# Altium footprint library Tramdo.PcbLib: 11 footprints
Each footprint in its own frame and in the unit in brackets; x right, y up, seen from the top. Pads: shape width x height; smd on the part's side, far side on the other; paste and mask are expansions set on the pad; w line width, h text height; cw(c..) or ccw(c..) is an arc to the next point about the centre after c.
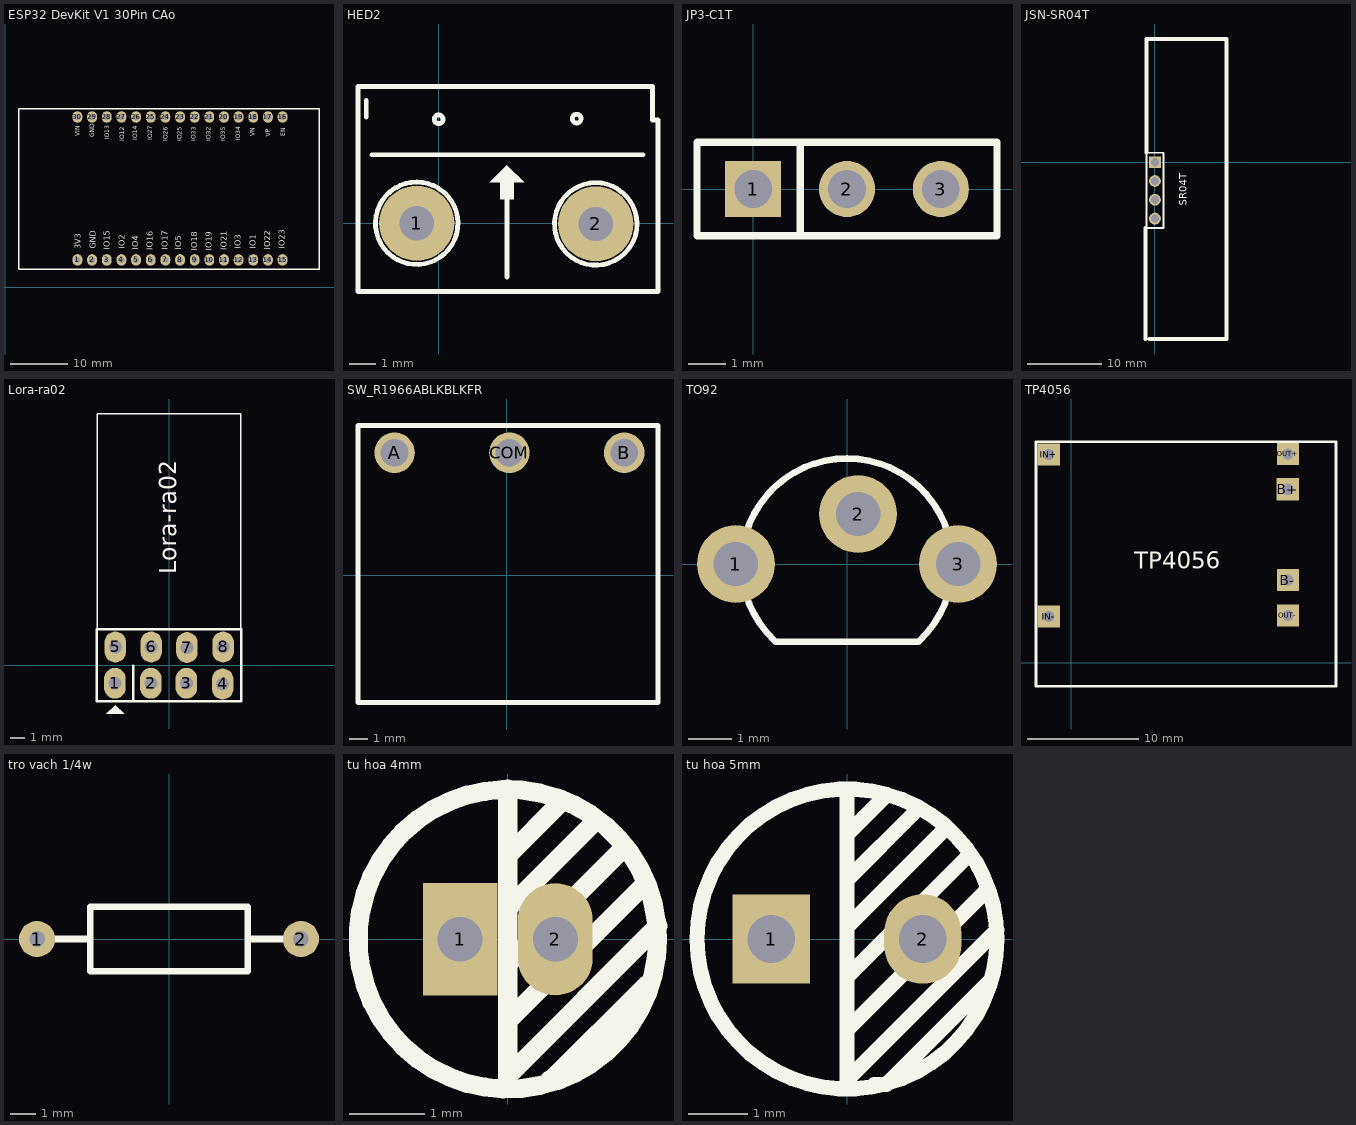
[diagram p0: the footprints below, top view; thin cyan lines are the x and y axes]

## ESP32 DevKit V1 30Pin CAo [mm]
pads (30):
  oval 1.7x2 hole 1: 1(12.505,4.719) 2(15.045,4.719) 3(17.585,4.719) 4(20.125,4.719) 5(22.665,4.719) 6(25.205,4.719) 7(27.745,4.719) 8(30.285,4.719) 9(32.825,4.719) 10(35.365,4.719) 11(37.905,4.719) 12(40.445,4.719) 13(42.985,4.719) 14(45.525,4.719) 15(48.065,4.719) 16(48.065,29.489) 17(45.525,29.489) 18(42.985,29.489) 19(40.445,29.489) 20(37.905,29.489) 21(35.365,29.489) 22(32.825,29.489) 23(30.285,29.489) 24(27.745,29.489) 25(25.205,29.489) 26(22.665,29.489) 27(20.125,29.489) 28(17.585,29.489) 29(15.045,29.489) 30(12.505,29.489)
Top Overlay:
  lines w0.254: 2.375,3.059 54.375,3.059 54.375,30.959 2.375,30.959 2.375,3.059
  text "EN" at 48.49,26.15 h0.76
  text "IO34" at 40.76,25.38 h0.76
  text "VN" at 43.28,26.12 h0.76
  text "IO32" at 35.64,25.3 h0.76
  text "IO35" at 38.1,25.27 h0.76
  text "VP" at 45.89,26.09 h0.76
  text "IO23" at 48.41,6.61 h1.02
  text "IO3" at 40.84,6.65 h1.02
  text "IO1" at 43.42,6.61 h1.02
  text "IO22" at 45.95,6.49 h1.02
  text "IO19" at 35.77,6.29 h1.02
  text "IO21" at 38.35,6.37 h1.02
  text "IO18" at 33.31,6.33 h1.02
  text "IO27" at 25.44,25.42 h0.76
  text "IO33" at 33.01,25.3 h0.76
  text "IO25" at 30.59,25.25 h0.76
  text "IO26" at 28.12,25.31 h0.76
  text "IO14" at 22.87,25.42 h0.76
  text "IO13" at 17.99,25.54 h0.76
  text "GND" at 15.46,25.99 h0.76
  text "VIN" at 12.9,26.14 h0.76
  text "IO17" at 28.2,6.45 h1.02
  text "IO5" at 30.5,6.49 h1.02
  text "IO16" at 25.55,6.37 h1.02
  text "IO4" at 23.01,6.52 h1.02
  text "IO12" at 20.58,25.31 h0.76
  text "IO2" at 20.67,6.64 h1.02
  text "GND" at 15.64,6.64 h1.02
  text "3V3" at 13.061,6.575 h1.02
  text "IO15" at 18.14,6.44 h1.02
3D body "ESP-32_v1.STEP": height 13.7, standoff 1.3, extent 2.54,2.91 53.47,31.41
3D body "PinSocket_1x15_P2.54mm_Vertical.step": height 7, standoff -3.1, extent 11.235,28.219 49.335,30.759
3D body "PinSocket_1x15_P2.54mm_Vertical.step": height 7, standoff -3.1, extent 11.235,3.449 49.335,5.989

## HED2 [mil] "Header 2, 2 pin, hight 300mil, Pin to Pin 200, Colour Green"
height 300
pads (2):
  round 110 hole 50: 1(-32,0) 2(230,-1)
Top Overlay:
  circle w7: c202,153 r6.4
  circle w7: c0,152 r6.4
  region: 100,85 75,60 90,60 90,35 110,35 110,60 125,60
  lines w7: -106,155 -106,180 ; -98,100 299,100 ; 6.72,46.1 ccw(c-32.11,-0.12) 8,45 ; 100,-79 100,72 ; 268.63,45.18 ccw(c229.89,-1.12) 270,44 ; -118,-100 321,-100 321,151 313,151 313,182 313,200 -118,200 -118,68 -118,-100
3D body "SW3dPS-KRM2.STEP": height 393.7, standoff -157.48, extent -96.7,-138.64 297,156.64

## JP3-C1T [mm] "3 row, straight, gold plating"
height 8.5
pads (3):
  rect 1.52x1.52 hole 1.02: 1(0,0)
  round 1.52 hole 1.02: 2(2.54,0) 3(5.08,0)
Top Overlay:
  lines w0.2: 1.27,-1.27 1.27,1.27 ; -1.52,-1.27 6.6,-1.27 6.6,1.27 -1.52,1.27 -1.52,-1.27
3D body "61300311821.stp": height 8.51, standoff -3.09, extent -1.52,-1.25 6.6,1.25

## JSN-SR04T [mm] "Sensor sieu am use 3.3V-5V"
pads (4):
  round 1.6 hole 1.1: Echo(0,-2.54) Trig(0,-5.08) VCC(0,-7.62)
  rect 1.6x1.6 hole 1.1: GND(0,0)
Top Overlay:
  lines w0.254: -1.143,-8.89 -1.143,1.27 1.143,1.27 1.143,-8.89 -1.143,-8.89
  lines w0.5: -1.27,-23.876 -1.27,-8.89 ; -1.143,1.27 -1.143,16.637 9.652,16.637 9.652,-23.876 -0.762,-23.876
  text "SR04T" at 4.318,-5.889 h1
Mechanical 1:
  lines w0.1: -1.27,-23.876 -0.762,-23.876 ; 9.525,16.51 9.652,16.637
3D body "User Library-RM254_4pin.STEP": height 6.03, standoff -3.09, extent -1.27,-9.017 1.27,1.143
3D body "JSN20.stp": height 23.27, standoff -10.25, extent -2.54,-25.125 15.61,16.235

## Lora-ra02 [mil] "Connector 4x2"
height 200
pads (8):
  oval 60x86 hole 36: 1(-150.5,-49.5) 2(-50.5,-49.5) 3(48.5,-49.5) 4(149.5,-51.5) 5(-149.5,51.5) 6(-49.5,51.5) 7(50,50) 8(150.5,51.5)
Top Overlay:
  region: -150,-110 -175,-135 -125,-135
  lines w3.94: -200,100 -200,700 200,700 200,100
  lines w7: -100,-99 -100,-1 ; -200.5,-99.5 200.5,-99.5 200.5,100.5 -200.5,100.5 -200.5,0.5 -200.5,-99.5
  text "Lora-ra02" at 20,253.28 h47.24
3D body "User Library-RA-02-2.sldprt": height 125.98, standoff 0, extent -309.88,46.06 320.04,715.35

## SW_R1966ABLKBLKFR [mm]
height 14.8
pads (3):
  round 2.2 hole 1.5: A(-6.071,6.629) B(6.375,6.629) COM(0.152,6.629)
Top Overlay:
  lines w0.254: -8.052,-6.897 -8.052,8.103 8.204,8.103 8.204,-6.897 -8.052,-6.897
3D body "step_temp.STEP": height 14.8, standoff -4.6, extent -10.82,-15.236 10.123,7.261

## TO92 [mil]
pads (3):
  round 70 hole 40: 1(-100,0) 2(10,45) 3(100,0)
Top Overlay:
  lines w6: -64.78,-69.48 cw(c0.01,0) -38.63,86.79 cw(c0,0) 38.64,86.79 cw(c-0.01,0) 64.78,-69.48 ; -64.21,-70 64.21,-70
3D body "step_temp.STEP": height 318.37, standoff -354.86, extent -107.87,-50 107.87,91.73

## TP4056 [mm]
pads (6):
  rect 2x2 hole 1: B+(19.482,15.621) B-(19.5,7.442) IN+(-2.032,18.745) IN-(-2.032,4.166) OUT+(19.5,18.796) OUT-(19.5,4.267)
Top Overlay:
  lines w0.254: -3.175,-2.108 23.825,-2.108 23.825,19.892 -3.175,19.892 -3.175,-2.108
  text "TP4056" at 5.69,8.484 h1.52
3D body "User Library-TP4056-1A-1.STEP": height 4.34, standoff 0.67, extent -3.874,2.879 25.095,19.879

## tro vach 1/4w [mm]
pads (2):
  round 1.4 hole 0.6: 1(-5.1,0) 2(5.1,0)
Top Overlay:
  lines w0.254: -4.394,0 -3.073,0 ; 3.099,0 4.42,0 ; -3.048,-1.25 3.048,-1.25 3.048,1.25 -3.048,1.25 -3.048,-1.25
3D body "Resistor 0.25W-1.step": height 2.41, standoff -2, extent -5.38,-1.2 5.38,1.2

## tu hoa 4mm [mm]
pads (2):
  rect 1x1.5 hole 0.6: 1(-0.635,0)
  oval 1x1.5 hole 0.6: 2(0.635,0)
Top Overlay:
  circle w0.254: c0,0 r2
  lines w0.254: 0,-1.956 0,2.007 ; 0,-1.803 0.025,-1.803 2.007,0.178 ; 0,-1.27 0,-1.092 1.829,0.737 ; 0,-0.381 0,-0.33 1.549,1.219 ; 0,0.279 0,0.406 1.143,1.549 ; 0,0.94 0,1.118 0.711,1.829 ; 0.559,-1.88 0.584,-1.88 1.854,-0.61
3D body "Cap electro 5x11x2mm.step": height 14.81, standoff 0.01, extent -2.474,-2.474 2.576,2.576

## tu hoa 5mm [mm]
pads (2):
  rect 1.3x1.5 hole 0.8: 1(-1.27,0)
  oval 1.3x1.5 hole 0.8: 2(1.27,0)
Top Overlay:
  circle w0.254: c0,0 r2.515
  lines w0.254: 0,-2.489 0,2.515 ; 0,-2.362 2.515,0.152 ; 0,-1.549 0,-1.524 2.362,0.838 ; 0,-0.737 0,-0.635 2.007,1.372 ; 0,0.203 1.651,1.854 ; 0,0.965 0,0.991 1.168,2.159 ; 0,1.727 0,1.321 0,1.753 0.61,2.362 ; 0.457,-2.438 0.66,-2.438 2.388,-0.711
3D body "Cap electro 6_3x11x2_5mm.step": height 14.55, standoff 0.01, extent -3.125,-3.175 3.226,3.175